# Altium schematic symbol library FPGA_Xilinx_Virtex5.SchLib: 41 symbols (part 6 of 17) (continued)
## XC5VLX85-FF676 (continued)
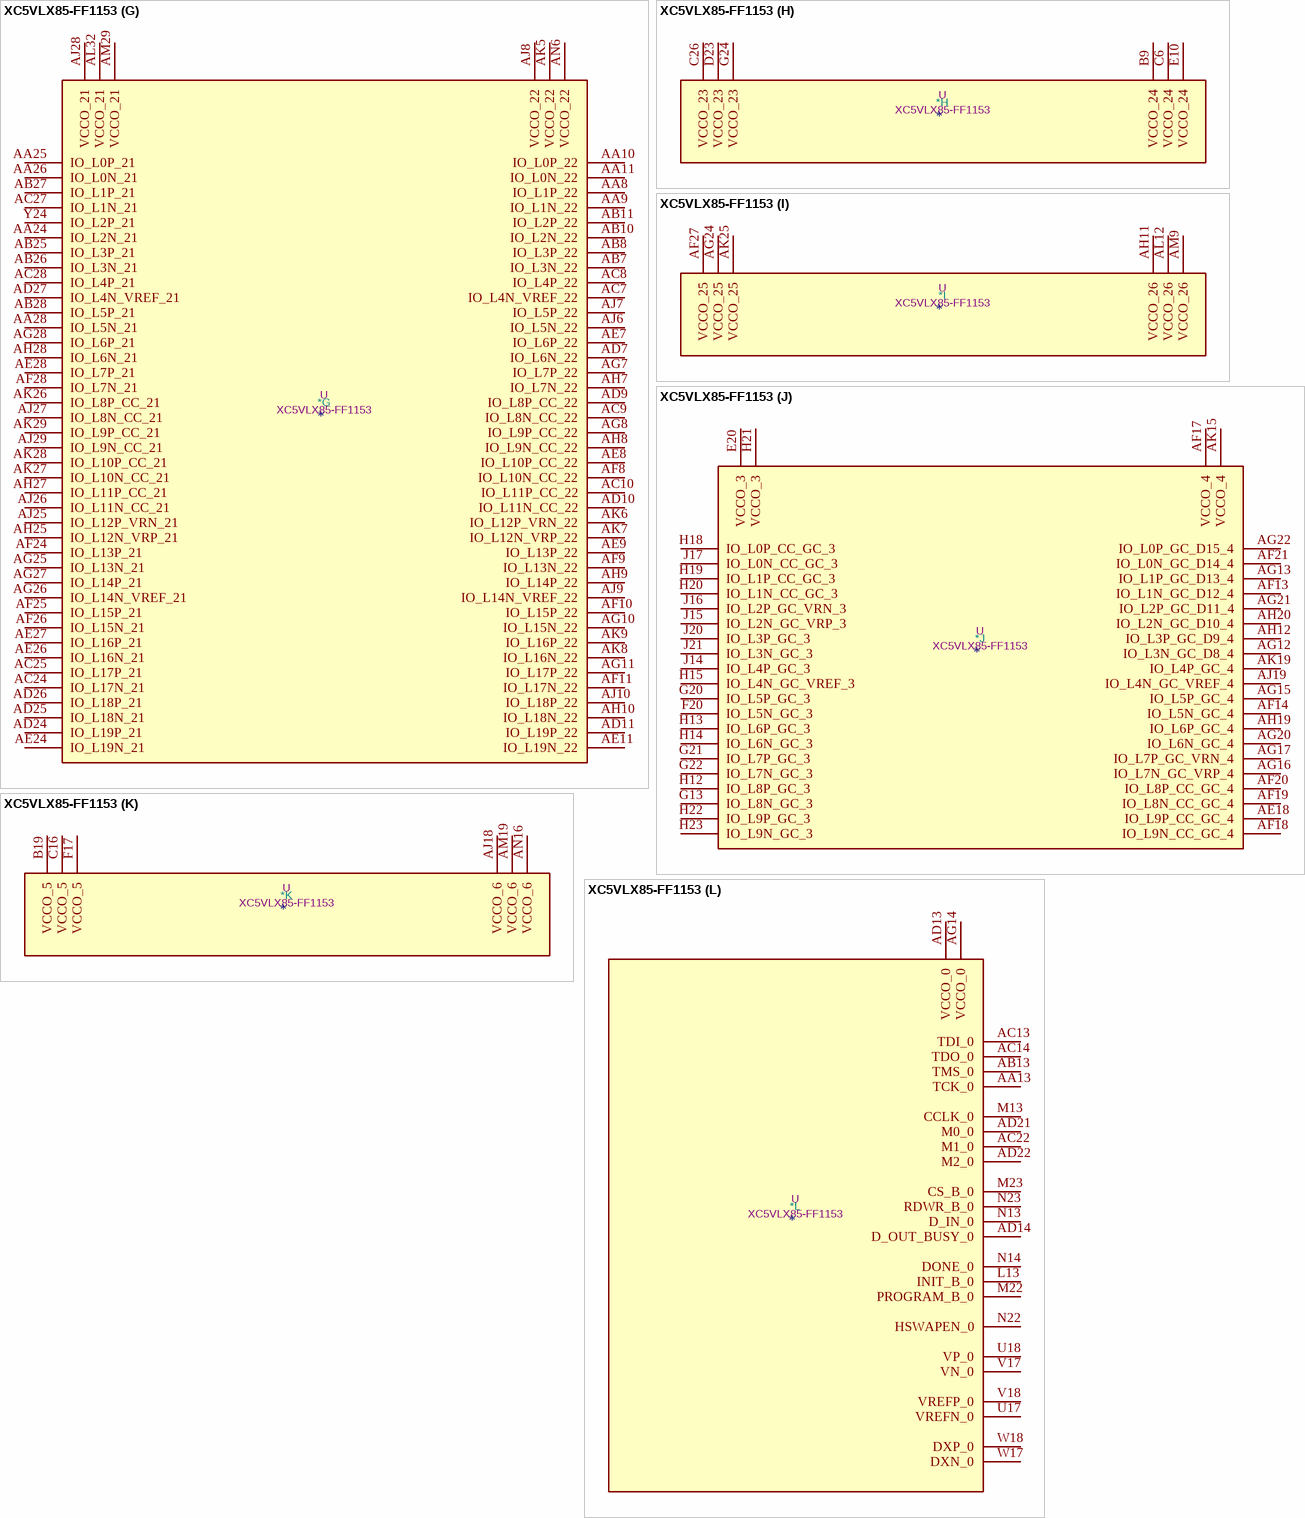
[diagram p51: symbol XC5VLX85-FF1153]

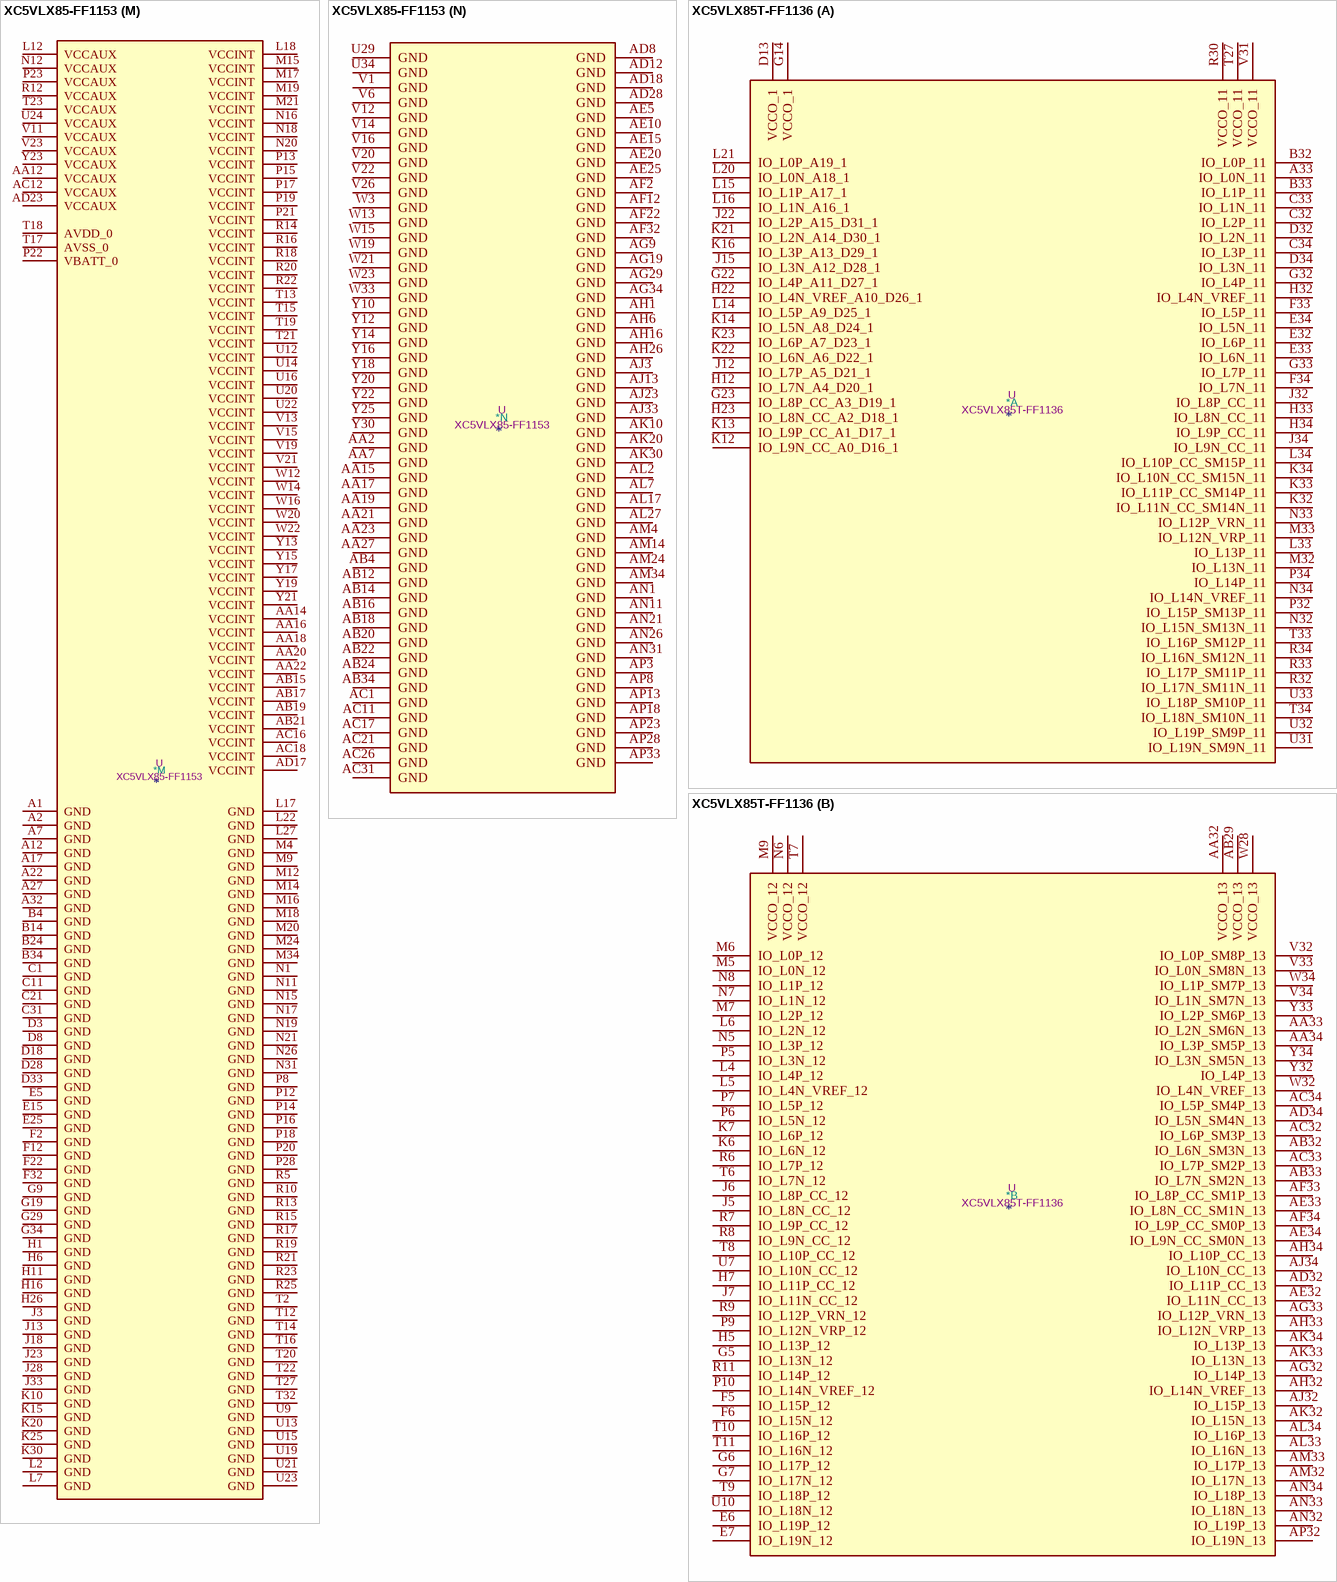
[diagram p52: symbols XC5VLX85-FF1153 to XC5VLX85T-FF1136]

## XC5VLX85-FF1153
designator *  value XC5VLX85-FF1153  Reference: U
ki_keywords: FPGA; ki_description: Virtex 5 LX 85 XC5VLX85-FF1153
part A pins: A33 IO_L0N_11, B32 IO_L0P_11, B33 IO_L1P_11, C32 IO_L2P_11, C33 IO_L1N_11, C34 IO_L3P_11, D13 VCCO_1, D32 IO_L2N_11, D34 IO_L3N_11, E32 IO_L6P_11, E33 IO_L6N_11, E34 IO_L5N_11, F33 IO_L5P_11, F34 IO_L7N_11, G14 VCCO_1, G32 IO_L4P_11, G33 IO_L7P_11, H32 IO_L4N_VREF_11, H33 IO_L8N_CC_11, H34 IO_L9P_CC_11, J12 IO_L5N_A8_D24_1, J19 IO_L4P_A11_D27_1, J22 IO_L6N_A6_D22_1, J32 IO_L8P_CC_11, J34 IO_L9N_CC_11, K12 IO_L5P_A9_D25_1, K13 IO_L7P_A5_D21_1, K14 IO_L7N_A4_D20_1, K16 IO_L3P_A13_D29_1, K17 IO_L1P_A17_1, K18 IO_L1N_A16_1, K19 IO_L4N_VREF_A10_D26_1, K21 IO_L2P_A15_D31_1, K22 IO_L6P_A7_D23_1, K23 IO_L8N_CC_A2_D18_1, K32 IO_L11N_CC_SM14N_11, K33 IO_L11P_CC_SM14P_11, K34 IO_L10N_CC_SM15N_11, L14 IO_L9P_CC_A1_D17_1, L15 IO_L9N_CC_A0_D16_1, L16 IO_L3N_A12_D28_1, L19 IO_L0N_A18_1, L20 IO_L0P_A19_1, L21 IO_L2N_A14_D30_1, L23 IO_L8P_CC_A3_D19_1, L33 IO_L13P_11, L34 IO_L10P_CC_SM15P_11, M32 IO_L13N_11, M33 IO_L12N_VRP_11, N32 IO_L15N_SM13N_11, N33 IO_L12P_VRN_11, N34 IO_L14N_VREF_11, P32 IO_L15P_SM13P_11, P33 VCCO_11, P34 IO_L14P_11, R30 VCCO_11, R32 IO_L17N_SM11N_11, R33 IO_L17P_SM11P_11, R34 IO_L16N_SM12N_11, T33 IO_L16P_SM12P_11, T34 IO_L18N_SM10N_11, U31 IO_L19P_SM9P_11, U32 IO_L19N_SM9N_11, U33 IO_L18P_SM10P_11, V31 VCCO_11
part B pins: A3 IO_L0P_12, AA32 VCCO_13, AA33 IO_L2P_SM6P_13, AA34 IO_L3P_SM5P_13, AB29 VCCO_13, AB32 IO_L6N_SM3N_13, AB33 IO_L7N_SM2N_13, AC32 IO_L6P_SM3P_13, AC33 IO_L7P_SM2P_13, AC34 IO_L5P_SM4P_13, AD32 IO_L11P_CC_13, AD34 IO_L5N_SM4N_13, AE32 IO_L11N_CC_13, AE33 IO_L8N_CC_SM1N_13, AE34 IO_L9N_CC_SM0N_13, AF33 IO_L8P_CC_SM1P_13, AF34 IO_L9P_CC_SM0P_13, AG32 IO_L14P_13, AG33 IO_L12P_VRN_13, AH32 IO_L14N_VREF_13, AH33 IO_L12N_VRP_13, AH34 IO_L10P_CC_13, AJ32 IO_L15P_13, AJ34 IO_L10N_CC_13, AK32 IO_L15N_13, AK33 IO_L13N_13, AK34 IO_L13P_13, AL33 IO_L16N_13, AL34 IO_L16P_13, AM32 IO_L17N_13, AM33 IO_L17P_13, AN32 IO_L19P_13, AN33 IO_L18N_13, AN34 IO_L18P_13, AP32 IO_L19N_13, B1 IO_L1N_12, B2 IO_L2N_12, B3 IO_L0N_12, C2 IO_L1P_12, C3 IO_L2P_12, D1 IO_L3N_12, D2 IO_L3P_12, E1 IO_L5N_12, E2 IO_L5P_12, E3 IO_L4P_12, F1 IO_L7P_12, F3 IO_L4N_VREF_12, G1 IO_L7N_12, G2 IO_L6N_12, G3 IO_L6P_12, H2 IO_L11P_CC_12, H3 IO_L11N_CC_12, J1 IO_L10N_CC_12, J2 IO_L9P_CC_12, K1 IO_L10P_CC_12, K2 IO_L9N_CC_12, K3 IO_L8P_CC_12, L1 IO_L12N_VRP_12, L3 IO_L8N_CC_12, M1 IO_L12P_VRN_12, M2 IO_L15N_12, M3 IO_L13P_12, N2 IO_L15P_12, N3 IO_L13N_12, P1 IO_L17P_12, P2 IO_L14P_12, R1 IO_L16N_12, R2 IO_L17N_12, R3 IO_L14N_VREF_12, T1 IO_L16P_12, T3 IO_L19N_12, T7 VCCO_12, U1 IO_L18P_12, U2 IO_L18N_12, U3 IO_L19P_12, U4 VCCO_12, V32 IO_L0N_SM8N_13, V33 IO_L0P_SM8P_13, V34 IO_L1N_SM7N_13, W8 VCCO_12, W28 VCCO_13, W32 IO_L4N_VREF_13, W34 IO_L1P_SM7P_13, Y32 IO_L4P_13, Y33 IO_L2N_SM6N_13, Y34 IO_L3N_SM5N_13
part C pins: AA1 IO_L5N_14, AA3 IO_L6N_14, AB1 IO_L5P_14, AB2 IO_L4N_VREF_14, AB3 IO_L6P_14, AB9 VCCO_14, AC2 IO_L7P_14, AC3 IO_L4P_14, AC6 VCCO_14, AD1 IO_L7N_14, AD2 IO_L8N_CC_14, AE1 IO_L9N_CC_14, AE2 IO_L8P_CC_14, AE3 IO_L11N_CC_14, AF1 IO_L9P_CC_14, AF3 IO_L11P_CC_14, AG1 IO_L10P_CC_14, AG2 IO_L10N_CC_14, AG3 IO_L15P_14, AH2 IO_L14P_14, AH3 IO_L15N_14, AJ1 IO_L12P_VRN_14, AJ2 IO_L14N_VREF_14, AK1 IO_L12N_VRP_14, AK2 IO_L13P_14, AK3 IO_L13N_14, AL1 IO_L16P_14, AL3 IO_L18N_14, AM1 IO_L16N_14, AM2 IO_L18P_14, AM3 IO_L19P_14, AN2 IO_L17P_14, AN3 IO_L19N_14, AP2 IO_L17N_14, E29 IO_L0P_15, E31 IO_L3N_15, F29 IO_L0N_15, F30 IO_L1N_15, F31 IO_L3P_15, G30 IO_L1P_15, G31 IO_L5N_15, H29 IO_L2P_15, H30 IO_L5P_15, H31 VCCO_15, J29 IO_L2N_15, J30 IO_L6P_15, J31 IO_L6N_15, K29 IO_L4P_15, K31 IO_L9P_CC_15, L29 IO_L4N_VREF_15, L30 IO_L7P_15, L31 IO_L9N_CC_15, L32 VCCO_15, M29 VCCO_15, M30 IO_L7N_15, M31 IO_L11N_CC_15, N29 IO_L8P_CC_15, N30 IO_L11P_CC_15, P29 IO_L8N_CC_15, P30 IO_L10N_CC_15, P31 IO_L10P_CC_15, R26 IO_L17P_15, R27 IO_L17N_15, R28 IO_L12P_VRN_15, R29 IO_L12N_VRP_15, R31 IO_L13N_15, T25 IO_L19N_15, T26 IO_L18N_15, T28 IO_L15P_15, T29 IO_L15N_15, T30 IO_L14N_VREF_15, T31 IO_L13P_15, U25 IO_L19P_15, U26 IO_L18P_15, U27 IO_L16P_15, U28 IO_L16N_15, U30 IO_L14P_15, V2 IO_L1N_14, V3 IO_L0N_14, V4 IO_L0P_14, W1 IO_L1P_14, W2 IO_L3P_14, Y1 IO_L3N_14, Y2 IO_L2N_14, Y3 IO_L2P_14, Y5 VCCO_14
part D pins: AA29 IO_L11P_CC_17, AA30 IO_L11N_CC_17, AA31 IO_L9N_CC_17, AB30 IO_L10N_CC_17, AB31 IO_L9P_CC_17, AC29 IO_L13N_17, AC30 IO_L10P_CC_17, AD29 IO_L15N_17, AD30 IO_L13P_17, AD31 IO_L12P_VRN_17, AD33 VCCO_17, AE29 IO_L15P_17, AE30 VCCO_17, AE31 IO_L12N_VRP_17, AF29 IO_L17P_17, AF30 IO_L17N_17, AF31 IO_L14P_17, AG30 IO_L19N_17, AG31 IO_L14N_VREF_17, AH29 IO_L19P_17, AH30 IO_L18N_17, AH31 VCCO_17, AJ30 IO_L18P_17, AJ31 IO_L16P_17, AK31 IO_L16N_17, E4 IO_L3P_16, F4 IO_L3N_16, F5 IO_L1N_16, G5 IO_L1P_16, H4 IO_L5P_16, H5 IO_L2N_16, J4 IO_L5N_16, J5 IO_L2P_16, J6 IO_L0P_16, K4 IO_L7P_16, K5 VCCO_16, K6 IO_L0N_16, L4 IO_L7N_16, L5 IO_L6N_16, L6 IO_L4P_16, M5 IO_L6P_16, M6 IO_L4N_VREF_16, N4 IO_L8P_CC_16, N5 IO_L8N_CC_16, N6 VCCO_16, P3 VCCO_16, P4 IO_L9P_CC_16, P5 IO_L11P_CC_16, P6 IO_L11N_CC_16, R4 IO_L9N_CC_16, R6 IO_L14P_16, R7 IO_L14N_VREF_16, R8 IO_L12N_VRP_16, R9 IO_L12P_VRN_16, R11 IO_L17P_16, T4 IO_L10N_CC_16, T5 IO_L13N_16, T6 IO_L15N_16, T8 IO_L16N_16, T9 IO_L18N_16, T10 IO_L17N_16, T11 IO_L19N_16, U5 IO_L10P_CC_16, U6 IO_L13P_16, U7 IO_L15P_16, U8 IO_L16P_16, U10 IO_L18P_16, U11 IO_L19P_16, V24 IO_L0N_17, V25 IO_L2P_17, V27 IO_L5N_17, V28 IO_L5P_17, V29 IO_L7N_17, V30 IO_L4P_17, W24 IO_L0P_17, W25 IO_L2N_17, W26 IO_L1N_17, W27 IO_L3N_17, W29 IO_L7P_17, W30 IO_L4N_VREF_17, W31 IO_L6P_17, Y26 IO_L1P_17, Y27 IO_L3P_17, Y28 IO_L8P_CC_17, Y29 IO_L8N_CC_17, Y31 IO_L6N_17
part E pins: AA4 IO_L10P_CC_18, AA5 IO_L8N_CC_18, AA6 IO_L8P_CC_18, AB5 IO_L10N_CC_18, AB6 IO_L11P_CC_18, AC4 IO_L12P_VRN_18, AC5 IO_L11N_CC_18, AD3 VCCO_18, AD4 IO_L12N_VRP_18, AD5 IO_L13P_18, AD6 IO_L13N_18, AE4 IO_L14P_18, AE6 IO_L15N_18, AF4 IO_L14N_VREF_18, AF5 IO_L15P_18, AF6 IO_L17P_18, AF7 VCCO_18, AG4 VCCO_18, AG5 IO_L19P_18, AG6 IO_L17N_18, AH4 IO_L16P_18, AH5 IO_L19N_18, AJ4 IO_L16N_18, AJ5 IO_L18N_18, AK4 IO_L18P_18, B29 VCCO_19, E26 IO_L11P_CC_19, E27 IO_L11N_CC_19, E28 IO_L10P_CC_19, E30 VCCO_19, F25 IO_L7P_19, F26 IO_L7N_19, F27 VCCO_19, F28 IO_L10N_CC_19, G25 IO_L5P_19, G26 IO_L5N_19, G27 IO_L8P_CC_19, G28 IO_L9N_CC_19, H24 IO_L6N_19, H25 IO_L6P_19, H27 IO_L8N_CC_19, H28 IO_L9P_CC_19, J24 IO_L2P_19, J25 IO_L2N_19, J26 IO_L4N_VREF_19, J27 IO_L4P_19, K24 IO_L0P_19, K26 IO_L14N_VREF_19, K27 IO_L14P_19, K28 IO_L13P_19, L24 IO_L0N_19, L25 IO_L1P_19, L26 IO_L1N_19, L28 IO_L13N_19, M25 IO_L3P_19, M26 IO_L3N_19, M27 IO_L12N_VRP_19, M28 IO_L15P_19, N24 IO_L17P_19, N25 IO_L18N_19, N27 IO_L12P_VRN_19, N28 IO_L15N_19, P24 IO_L17N_19, P25 IO_L18P_19, P26 IO_L16P_19, P27 IO_L16N_19, R24 IO_L19P_19, T24 IO_L19N_19, V5 IO_L5N_18, V7 IO_L4N_VREF_18, V8 IO_L3N_18, V9 IO_L3P_18, V10 IO_L2N_18, W4 IO_L9N_CC_18, W5 IO_L5P_18, W6 IO_L7N_18, W7 IO_L4P_18, W9 IO_L1P_18, W10 IO_L2P_18, W11 IO_L0N_18, Y4 IO_L9P_CC_18, Y6 IO_L7P_18, Y7 IO_L6P_18, Y8 IO_L6N_18, Y9 IO_L1N_18, Y11 IO_L0P_18
part F pins: AC15 IO_L0P_CC_RS1_2, AC19 IO_L9P_D1_FS1_2, AC20 IO_L9N_D0_FS0_2, AD15 IO_L0N_CC_RS0_2, AD16 IO_L8P_D3_2, AD19 IO_L7P_D5_2, AD20 IO_L5P_FWE_B_2, AE12 IO_L4P_FCS_B_2, AE13 IO_L4N_VREF_FOE_B_MOSI_2, AE14 IO_L2N_A22_2, AE16 IO_L6P_D7_2, AE17 IO_L8N_D2_FS2_2, AE19 IO_L7N_D4_2, AE21 IO_L5N_CSO_B_2, AE22 IO_L1P_CC_A25_2, AE23 IO_L1N_CC_A24_2, AF15 IO_L2P_A23_2, AF16 IO_L6N_D6_2, AF23 IO_L3N_A20_2, AG23 IO_L3P_A21_2, AH21 VCCO_2, AL22 VCCO_2, E6 IO_L10N_CC_20, E7 IO_L5P_20, E8 IO_L5N_20, E9 IO_L3N_20, F6 IO_L10P_CC_20, F7 VCCO_20, F8 IO_L7N_20, F9 IO_L7P_20, F10 IO_L3P_20, G4 VCCO_20, G6 IO_L14P_20, G7 IO_L14N_VREF_20, G8 IO_L9N_CC_20, G10 IO_L1N_20, H7 IO_L12P_VRN_20, H8 IO_L12N_VRP_20, H9 IO_L9P_CC_20, H10 IO_L1P_20, J7 IO_L13N_20, J8 VCCO_20, J9 IO_L2N_20, J10 IO_L2P_20, J11 IO_L0N_20, K7 IO_L13P_20, K8 IO_L11N_CC_20, K9 IO_L8P_CC_20, K11 IO_L0P_20, L8 IO_L11P_CC_20, L9 IO_L8N_CC_20, L10 IO_L4N_VREF_20, L11 IO_L4P_20, M7 IO_L15N_20, M8 IO_L15P_20, M10 IO_L6N_20, M11 IO_L6P_20, N7 IO_L16N_20, N8 IO_L18N_20, N9 IO_L17P_20, N10 IO_L17N_20, P7 IO_L16P_20, P9 IO_L18P_20, P10 IO_L19N_20, P11 IO_L19P_20
part G pins: AA8 IO_L1P_22, AA9 IO_L1N_22, AA10 IO_L0P_22, AA11 IO_L0N_22, AA24 IO_L2N_21, AA25 IO_L0P_21, AA26 IO_L0N_21, AA28 IO_L5N_21, AB7 IO_L3N_22, AB8 IO_L3P_22, AB10 IO_L2N_22, AB11 IO_L2P_22, AB25 IO_L3P_21, AB26 IO_L3N_21, AB27 IO_L1P_21, AB28 IO_L5P_21, AC7 IO_L4N_VREF_22, AC8 IO_L4P_22, AC9 IO_L8N_CC_22, AC10 IO_L11P_CC_22, AC24 IO_L17N_21, AC25 IO_L17P_21, AC27 IO_L1N_21, AC28 IO_L4P_21, AD7 IO_L6N_22, AD9 IO_L8P_CC_22, AD10 IO_L11N_CC_22, AD11 IO_L19P_22, AD24 IO_L19P_21, AD25 IO_L18N_21, AD26 IO_L18P_21, AD27 IO_L4N_VREF_21, AE7 IO_L6P_22, AE8 IO_L10P_CC_22, AE9 IO_L13P_22, AE11 IO_L19N_22, AE24 IO_L19N_21, AE26 IO_L16N_21, AE27 IO_L16P_21, AE28 IO_L7P_21, AF8 IO_L10N_CC_22, AF9 IO_L13N_22, AF10 IO_L15P_22, AF11 IO_L17N_22, AF24 IO_L13P_21, AF25 IO_L15P_21, AF26 IO_L15N_21, AF28 IO_L7N_21, AG7 IO_L7P_22, AG8 IO_L9P_CC_22, AG10 IO_L15N_22, AG11 IO_L17P_22, AG25 IO_L13N_21, AG26 IO_L14N_VREF_21, AG27 IO_L14P_21, AG28 IO_L6P_21, AH7 IO_L7N_22, AH8 IO_L9N_CC_22, AH9 IO_L14P_22, AH10 IO_L18N_22, AH25 IO_L12N_VRP_21, AH27 IO_L11P_CC_21, AH28 IO_L6N_21, AJ6 IO_L5N_22, AJ7 IO_L5P_22, AJ8 VCCO_22, AJ9 IO_L14N_VREF_22, AJ10 IO_L18P_22, AJ25 IO_L12P_VRN_21, AJ26 IO_L11N_CC_21, AJ27 IO_L8N_CC_21, AJ28 VCCO_21, AJ29 IO_L9N_CC_21, AK5 VCCO_22, AK6 IO_L12P_VRN_22, AK7 IO_L12N_VRP_22, AK8 IO_L16N_22, AK9 IO_L16P_22, AK26 IO_L8P_CC_21, AK27 IO_L10N_CC_21, AK28 IO_L10P_CC_21, AK29 IO_L9P_CC_21, AL32 VCCO_21, AM29 VCCO_21, AN6 VCCO_22, Y24 IO_L2P_21
part H pins: B9 VCCO_24, C6 VCCO_24, C26 VCCO_23, D23 VCCO_23, E10 VCCO_24, G24 VCCO_23
part I pins: AF27 VCCO_25, AG24 VCCO_25, AH11 VCCO_26, AK25 VCCO_25, AL12 VCCO_26, AM9 VCCO_26
part J pins: AE18 IO_L9P_CC_GC_4, AF13 IO_L1N_GC_D12_4, AF14 IO_L5N_GC_4, AF17 VCCO_4, AF18 IO_L9N_CC_GC_4, AF19 IO_L8N_CC_GC_4, AF20 IO_L8P_CC_GC_4, AF21 IO_L0N_GC_D14_4, AG12 IO_L3N_GC_D8_4, AG13 IO_L1P_GC_D13_4, AG15 IO_L5P_GC_4, AG16 IO_L7N_GC_VRP_4, AG17 IO_L7P_GC_VRN_4, AG20 IO_L6N_GC_4, AG21 IO_L2P_GC_D11_4, AG22 IO_L0P_GC_D15_4, AH12 IO_L3P_GC_D9_4, AH19 IO_L6P_GC_4, AH20 IO_L2N_GC_D10_4, AJ19 IO_L4N_GC_VREF_4, AK15 VCCO_4, AK19 IO_L4P_GC_4, E20 VCCO_3, F20 IO_L5N_GC_3, G13 IO_L8N_GC_3, G20 IO_L5P_GC_3, G21 IO_L7P_GC_3, G22 IO_L7N_GC_3, H12 IO_L8P_GC_3, H13 IO_L6P_GC_3, H14 IO_L6N_GC_3, H15 IO_L4N_GC_VREF_3, H18 IO_L0P_CC_GC_3, H19 IO_L1P_CC_GC_3, H20 IO_L1N_CC_GC_3, H21 VCCO_3, H22 IO_L9P_GC_3, H23 IO_L9N_GC_3, J14 IO_L4P_GC_3, J15 IO_L2N_GC_VRP_3, J16 IO_L2P_GC_VRN_3, J17 IO_L0N_CC_GC_3, J20 IO_L3P_GC_3, J21 IO_L3N_GC_3
part K pins: AJ18 VCCO_6, AM19 VCCO_6, AN16 VCCO_6, B19 VCCO_5, C16 VCCO_5, F17 VCCO_5
part L pins: AA13 TCK_0, AB13 TMS_0, AC13 TDI_0, AC14 TDO_0, AC22 M1_0, AD13 VCCO_0, AD14 D_OUT_BUSY_0, AD21 M0_0, AD22 M2_0, AG14 VCCO_0, L13 INIT_B_0, M13 CCLK_0, M22 PROGRAM_B_0, M23 CS_B_0, N13 D_IN_0, N14 DONE_0, N22 HSWAPEN_0, N23 RDWR_B_0, U17 VREFN_0, U18 VP_0, V17 VN_0, V18 VREFP_0, W17 DXN_0, W18 DXP_0
part M pins: A1 GND, A2 GND, A7 GND, A12 GND, A17 GND, A22 GND, A27 GND, A32 GND, AA12 VCCAUX, AA14 VCCINT, AA16 VCCINT, AA18 VCCINT, AA20 VCCINT, AA22 VCCINT, AB15 VCCINT, AB17 VCCINT, AB19 VCCINT, AB21 VCCINT, AC12 VCCAUX, AC16 VCCINT, AC18 VCCINT, AD17 VCCINT, AD23 VCCAUX, B4 GND, B14 GND, B24 GND, B34 GND, C1 GND, C11 GND, C21 GND, C31 GND, D3 GND, D8 GND, D18 GND, D28 GND, D33 GND, E5 GND, E15 GND, E25 GND, F2 GND, F12 GND, F22 GND, F32 GND, G9 GND, G19 GND, G29 GND, G34 GND, H1 GND, H6 GND, H11 GND, H16 GND, H26 GND, J3 GND, J13 GND, J18 GND, J23 GND, J28 GND, J33 GND, K10 GND, K15 GND, K20 GND, K25 GND, K30 GND, L2 GND, L7 GND, L12 VCCAUX, L17 GND, L18 VCCINT, L22 GND, L27 GND, M4 GND, M9 GND, M12 GND, M14 GND, M15 VCCINT, M16 GND, M17 VCCINT, M18 GND, M19 VCCINT, M20 GND, M21 VCCINT, M24 GND, M34 GND, N1 GND, N11 GND, N12 VCCAUX, N15 GND, N16 VCCINT, N17 GND, N18 VCCINT, N19 GND, N20 VCCINT, N21 GND, N26 GND, N31 GND, P8 GND, P12 GND, P13 VCCINT, P14 GND, P15 VCCINT, P16 GND, P17 VCCINT, P18 GND, P19 VCCINT, P20 GND, P21 VCCINT, P22 VBATT_0, P23 VCCAUX, P28 GND, R5 GND, R10 GND, R12 VCCAUX, R13 GND, R14 VCCINT, R15 GND, R16 VCCINT, R17 GND, R18 VCCINT, R19 GND, R20 VCCINT, R21 GND, R22 VCCINT, R23 GND, R25 GND, T2 GND, T12 GND, T13 VCCINT, T14 GND, T15 VCCINT, T16 GND, T17 AVSS_0, T18 AVDD_0, T19 VCCINT, T20 GND, T21 VCCINT, T22 GND, T23 VCCAUX, T27 GND, T32 GND, U9 GND, U12 VCCINT, U13 GND, U14 VCCINT, U15 GND, U16 VCCINT, U19 GND, U20 VCCINT, U21 GND, U22 VCCINT, U23 GND, U24 VCCAUX, V11 VCCAUX, V13 VCCINT, V15 VCCINT, V19 VCCINT, V21 VCCINT, V23 VCCAUX, W12 VCCINT, W14 VCCINT, W16 VCCINT, W20 VCCINT, W22 VCCINT, Y13 VCCINT, Y15 VCCINT, Y17 VCCINT, Y19 VCCINT, Y21 VCCINT, Y23 VCCAUX
part N pins: AA2 GND, AA7 GND, AA15 GND, AA17 GND, AA19 GND, AA21 GND, AA23 GND, AA27 GND, AB4 GND, AB12 GND, AB14 GND, AB16 GND, AB18 GND, AB20 GND, AB22 GND, AB24 GND, AB34 GND, AC1 GND, AC11 GND, AC17 GND, AC21 GND, AC26 GND, AC31 GND, AD8 GND, AD12 GND, AD18 GND, AD28 GND, AE5 GND, AE10 GND, AE15 GND, AE20 GND, AE25 GND, AF2 GND, AF12 GND, AF22 GND, AF32 GND, AG9 GND, AG19 GND, AG29 GND, AG34 GND, AH1 GND, AH6 GND, AH16 GND, AH26 GND, AJ3 GND, AJ13 GND, AJ23 GND, AJ33 GND, AK10 GND, AK20 GND, AK30 GND, AL2 GND, AL7 GND, AL17 GND, AL27 GND, AM4 GND, AM14 GND, AM24 GND, AM34 GND, AN1 GND, AN11 GND, AN21 GND, AN26 GND, AN31 GND, AP3 GND, AP8 GND, AP13 GND, AP18 GND, AP23 GND, AP28 GND, AP33 GND, U29 GND, U34 GND, V1 GND, V6 GND, V12 GND, V14 GND, V16 GND, V20 GND, V22 GND, V26 GND, W3 GND, W13 GND, W15 GND, W19 GND, W21 GND, W23 GND, W33 GND, Y10 GND, Y12 GND, Y14 GND, Y16 GND, Y18 GND, Y20 GND, Y22 GND, Y25 GND, Y30 GND

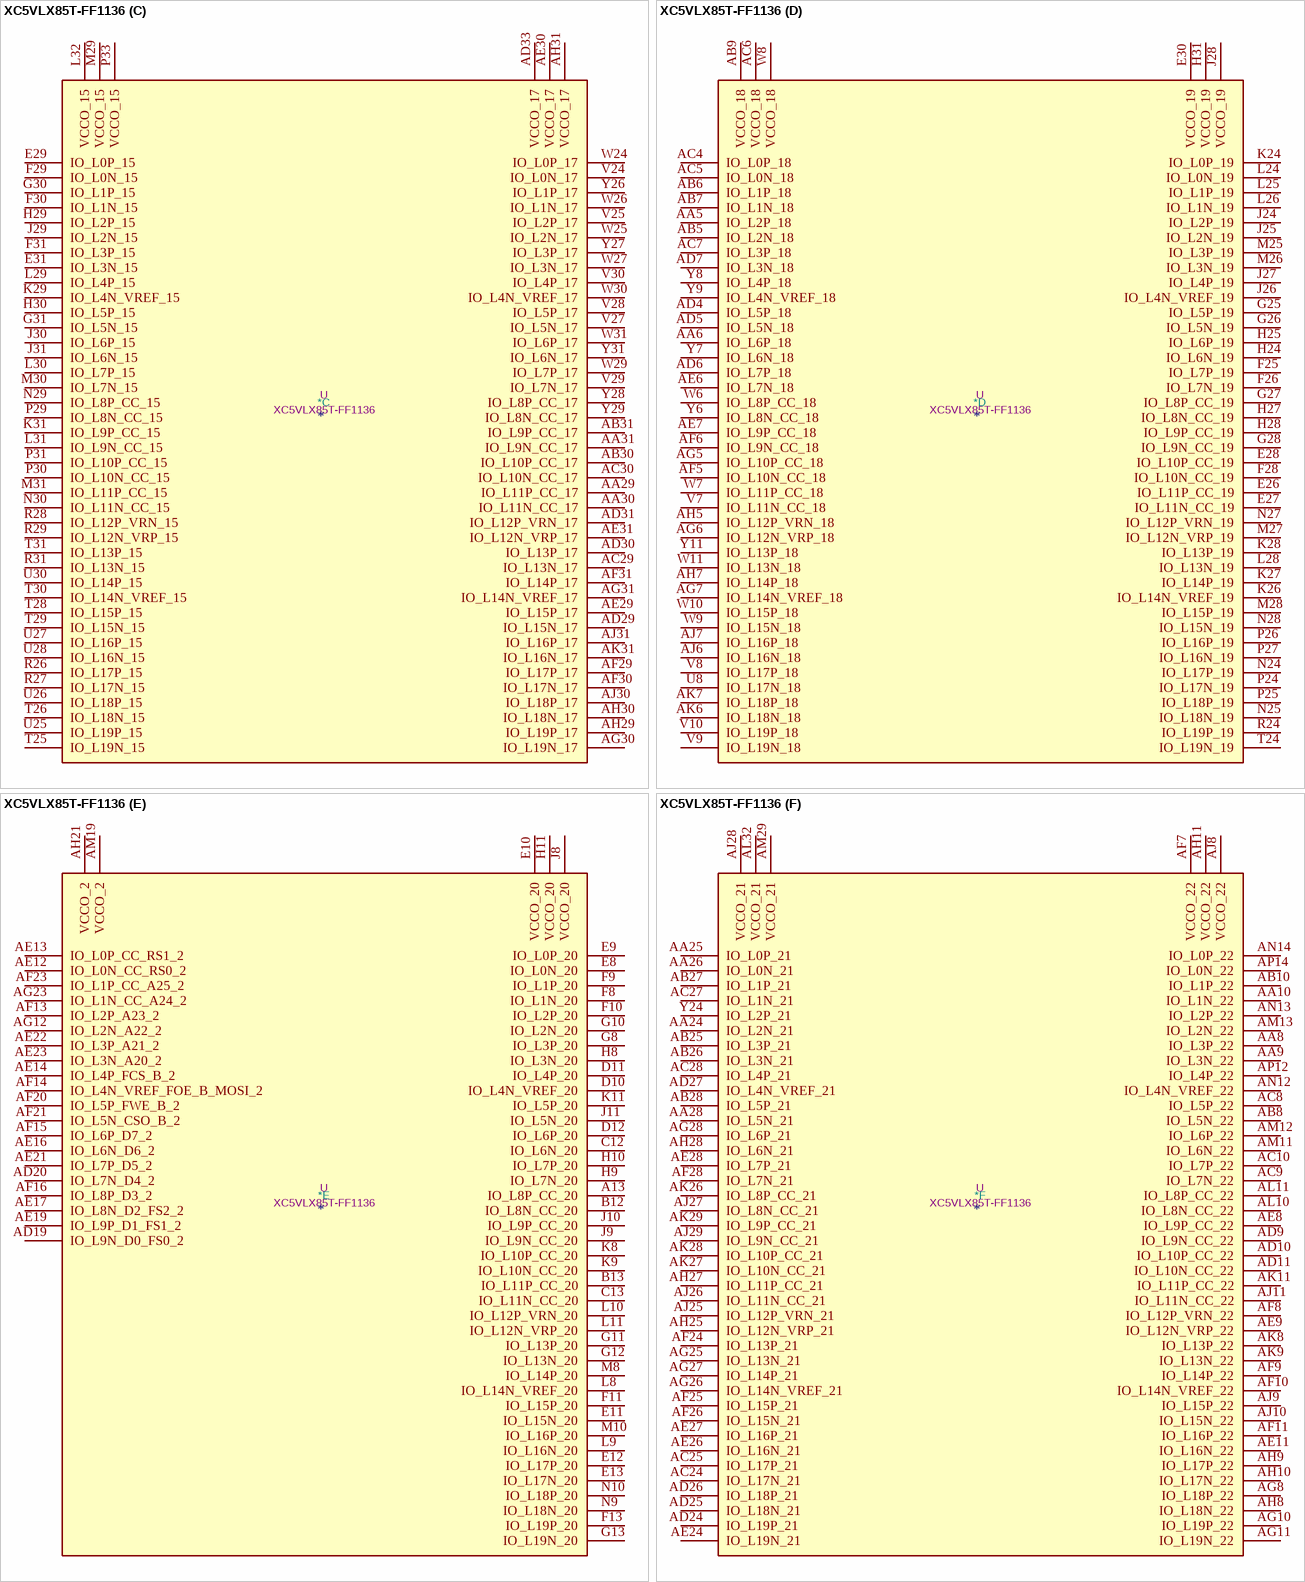
[diagram p53: symbol XC5VLX85T-FF1136]

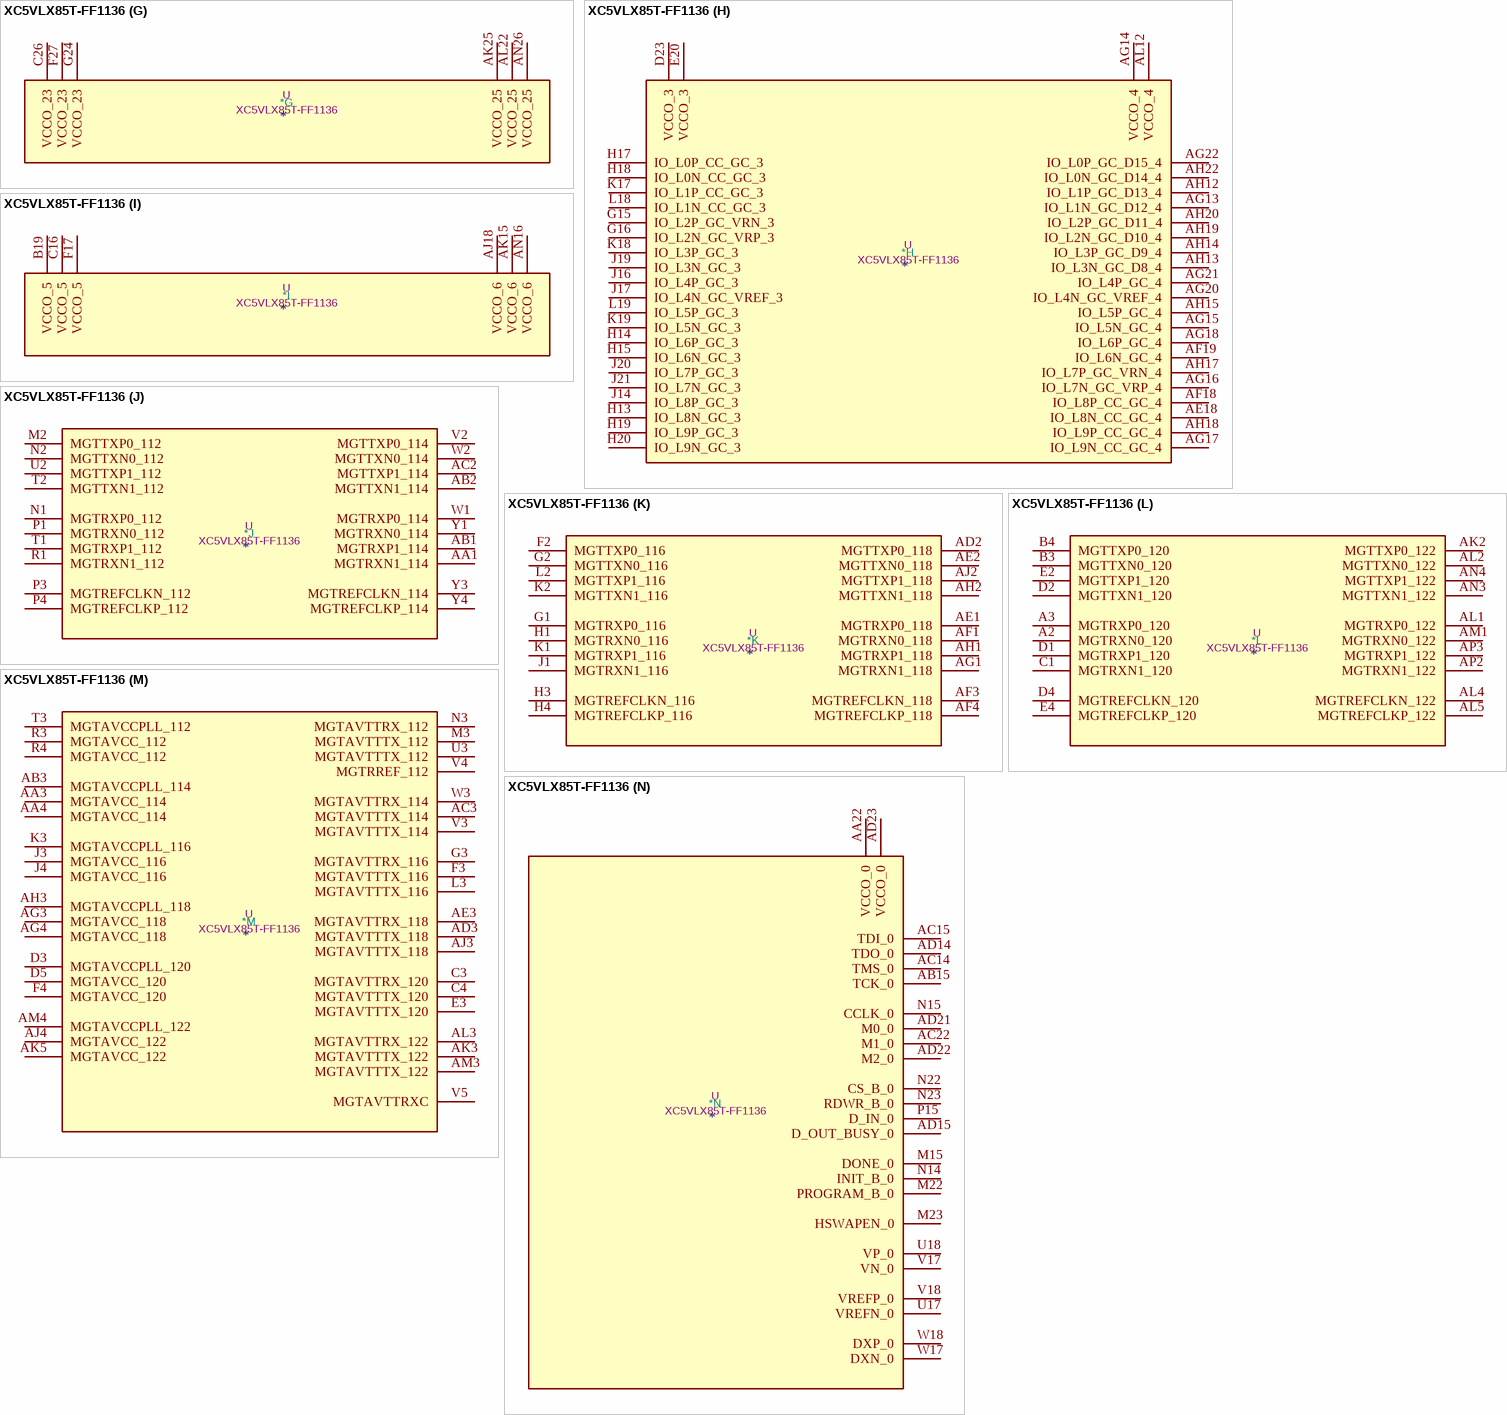
[diagram p54: symbol XC5VLX85T-FF1136]

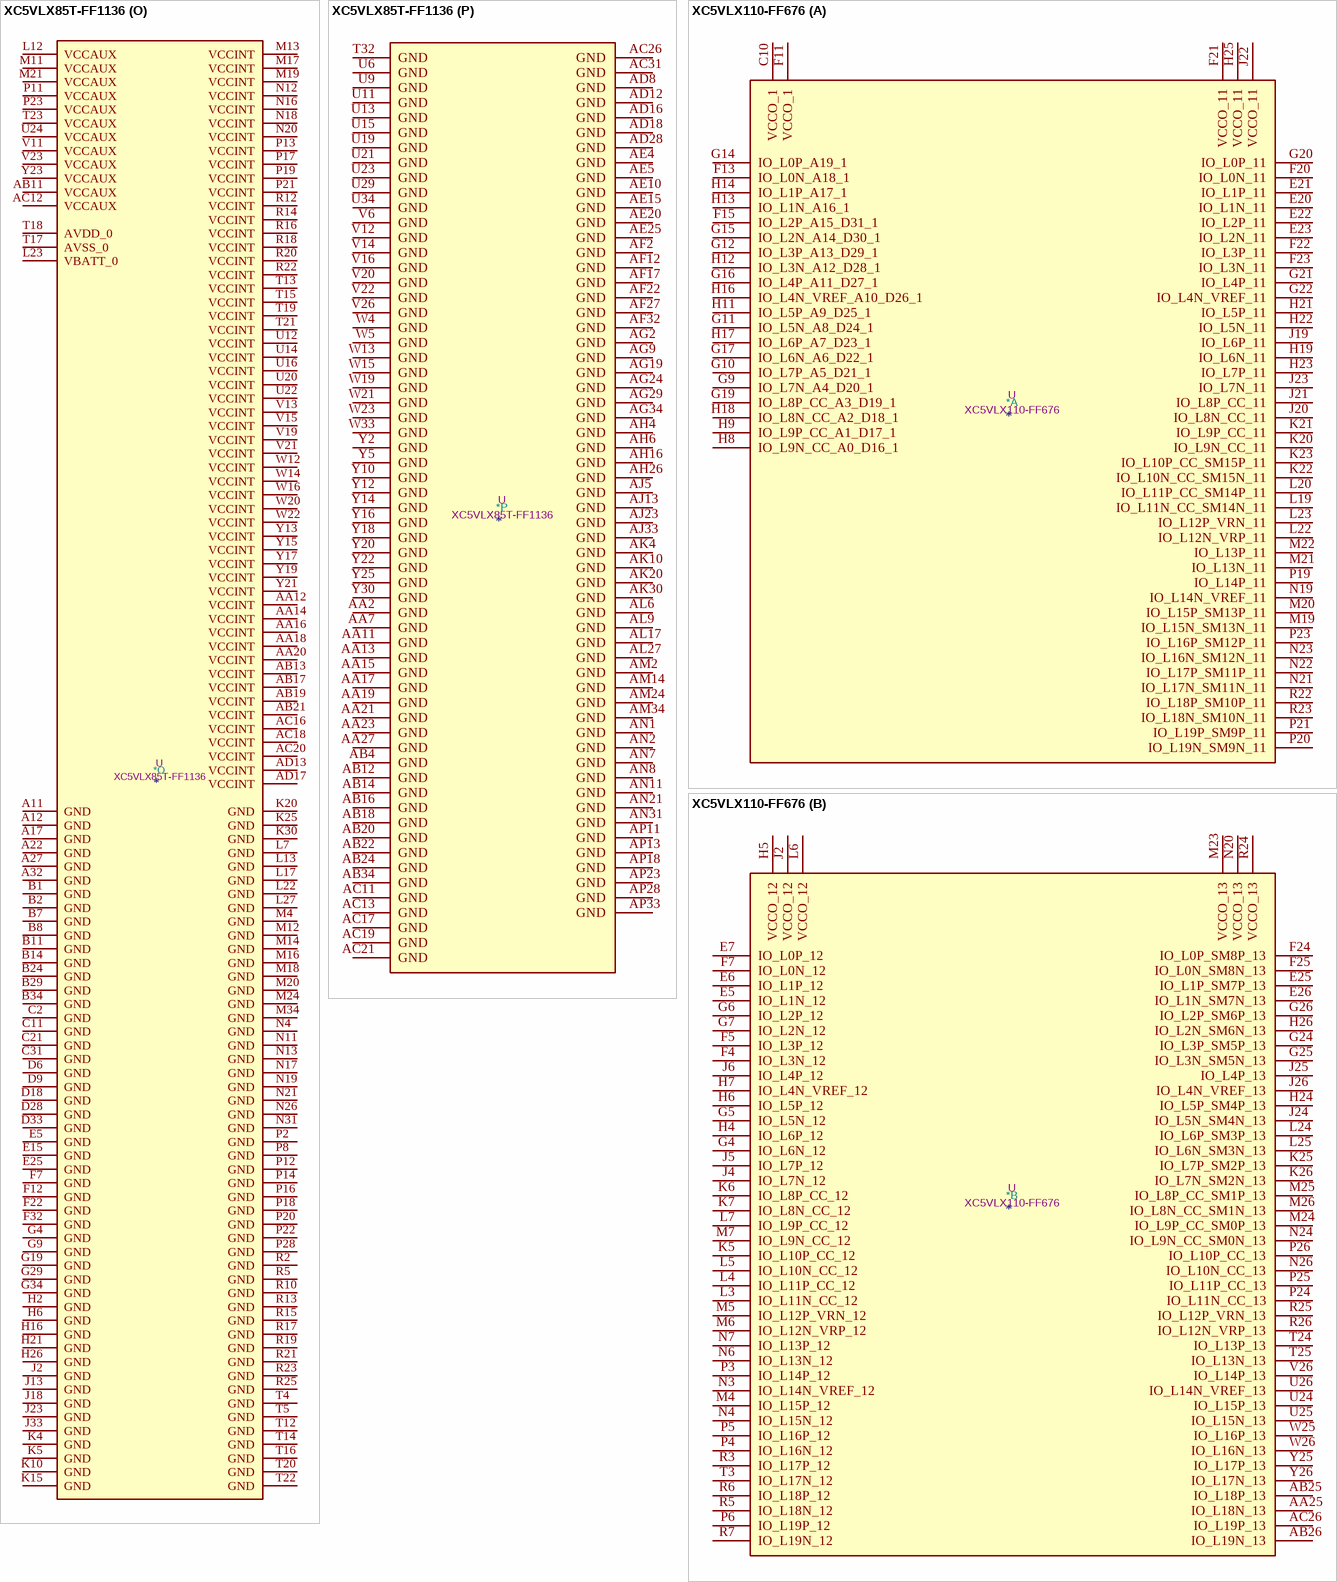
[diagram p55: symbols XC5VLX85T-FF1136 to XC5VLX110-FF676]